# Altium schematic symbol library jlcpcb_2025_04_capacitors_extended_0402.schlib: 3594 symbols (part 19 of 20)
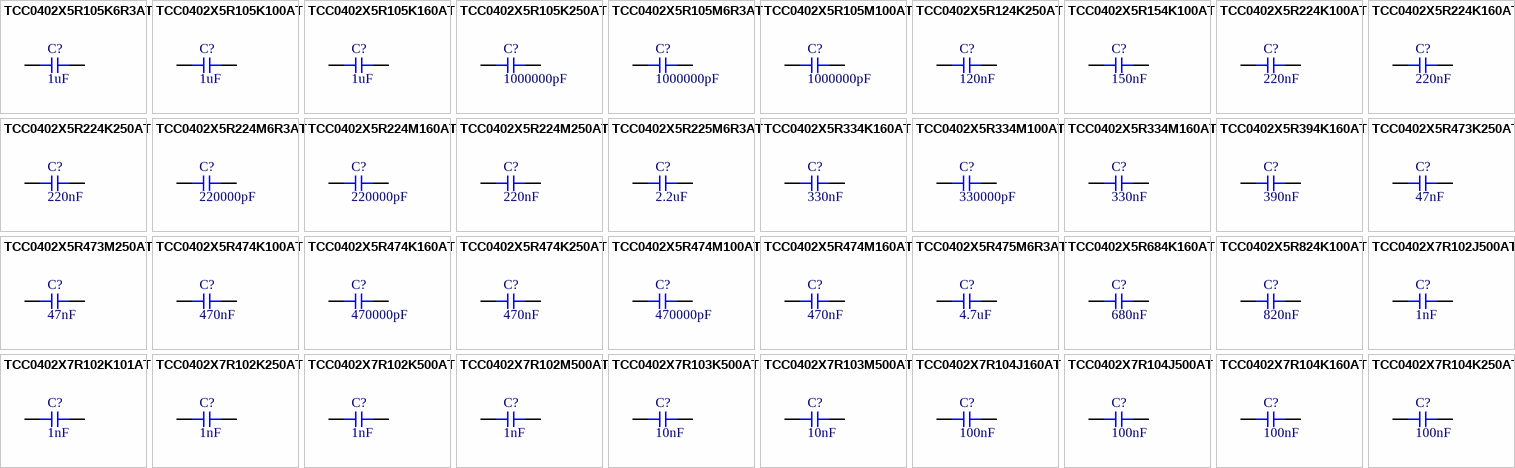
[diagram p107: symbols TCC0402X5R105K6R3AT to TCC0402X7R104K250AT]

## TCC0402X5R334M100AT
designator C?  Capacitance: 330000pF  (hidden comment: *)
Capacitor, Ceramic (MLCC), 330000pF, ±20%, 10V, X5R, ±20%, SMD 0402; Manufacturer: CCTC; Manufacturer Part Number: TCC0402X5R334M100AT; Package Size: 0402; JLCPCB Basic Part: No; JLCPCB Part Number: C5142578; Supplier 1: LCSC; Category: Capacitors - MLCC; Supplier Part Number 1: C5142578; Tolerance: ±20%; Voltage Rating: 10V; Temperature Coefficient: X5R; RoHS: Yes; ComponentLink1Description: Datasheet; ComponentLink1URL: https://wmsc.lcsc.com/wmsc/upload/file/pdf/v2/lcsc/2209011730_CCTC-TCC0402X5R334M100AT_C5142578.pdf; ComponentLink2Description: JLCPCB Part URL; ComponentLink2URL: https://jlcpcb.com/partdetail/C5142578; ComponentLink3Description: LCSC Part URL; ComponentLink3URL: https://lcsc.com/product-detail/Multilayer-Ceramic-Capacitors-MLCC---SMD-SMT_CCTC-CCTC-TCC0402X5R334M100AT_C5142578.html
footprint CAP-0402 (0402 (1005M) Capacitor)
pins: 1, 2

## TCC0402X5R334M160AT
designator C?  Capacitance: 330nF  (hidden comment: *)
Capacitor, Ceramic (MLCC), 330nF, ±20%, 16V, X5R, ±20%, SMD 0402; Manufacturer: CCTC; Manufacturer Part Number: TCC0402X5R334M160AT; Package Size: 0402; JLCPCB Basic Part: No; JLCPCB Part Number: C7393856; Supplier 1: LCSC; Category: Capacitors - MLCC; Supplier Part Number 1: C7393856; Tolerance: ±20%; Voltage Rating: 16V; Temperature Coefficient: X5R; RoHS: Yes; ComponentLink1Description: Datasheet; ComponentLink1URL: https://wmsc.lcsc.com/wmsc/upload/file/pdf/v2/lcsc/2306211554_CCTC-TCC0402X5R334M160AT_C7393856.pdf; ComponentLink2Description: JLCPCB Part URL; ComponentLink2URL: https://jlcpcb.com/partdetail/C7393856; ComponentLink3Description: LCSC Part URL; ComponentLink3URL: https://lcsc.com/product-detail/Multilayer-Ceramic-Capacitors-MLCC---SMD-SMT_CCTC-CCTC-TCC0402X5R334M160AT_C7393856.html
footprint CAP-0402 (0402 (1005M) Capacitor)
pins: 1, 2

## TCC0402X5R394K160AT
designator C?  Capacitance: 390nF  (hidden comment: *)
Capacitor, Ceramic (MLCC), 390nF, ±10%, 16V, X5R, ±10%, SMD 0402; Manufacturer: CCTC; Manufacturer Part Number: TCC0402X5R394K160AT; Package Size: 0402; JLCPCB Basic Part: No; JLCPCB Part Number: C7393858; Supplier 1: LCSC; Category: Capacitors - MLCC; Supplier Part Number 1: C7393858; Tolerance: ±10%; Voltage Rating: 16V; Temperature Coefficient: X5R; RoHS: Yes; ComponentLink1Description: Datasheet; ComponentLink1URL: https://wmsc.lcsc.com/wmsc/upload/file/pdf/v2/lcsc/2306211554_CCTC-TCC0402X5R394K160AT_C7393858.pdf; ComponentLink2Description: JLCPCB Part URL; ComponentLink2URL: https://jlcpcb.com/partdetail/C7393858; ComponentLink3Description: LCSC Part URL; ComponentLink3URL: https://lcsc.com/product-detail/Multilayer-Ceramic-Capacitors-MLCC---SMD-SMT_CCTC-CCTC-TCC0402X5R394K160AT_C7393858.html
footprint CAP-0402 (0402 (1005M) Capacitor)
pins: 1, 2

## TCC0402X5R473K250AT
designator C?  Capacitance: 47nF  (hidden comment: *)
Capacitor, Ceramic (MLCC), 47nF, ±10%, 25V, X5R, ±10%, SMD 0402; Manufacturer: CCTC; Manufacturer Part Number: TCC0402X5R473K250AT; Package Size: 0402; JLCPCB Basic Part: No; JLCPCB Part Number: C696842; Supplier 1: LCSC; Category: Capacitors - MLCC; Supplier Part Number 1: C696842; Tolerance: ±10%; Voltage Rating: 25V; Temperature Coefficient: X5R; RoHS: Yes; ComponentLink1Description: Datasheet; ComponentLink1URL: https://wmsc.lcsc.com/wmsc/upload/file/pdf/v2/lcsc/2304140030_CCTC-TCC0402X5R473K250AT_C696842.pdf; ComponentLink2Description: JLCPCB Part URL; ComponentLink2URL: https://jlcpcb.com/partdetail/C696842; ComponentLink3Description: LCSC Part URL; ComponentLink3URL: https://lcsc.com/product-detail/Multilayer-Ceramic-Capacitors-MLCC---SMD-SMT_CCTC-CCTC-TCC0402X5R473K250AT_C696842.html
footprint CAP-0402 (0402 (1005M) Capacitor)
pins: 1, 2

## TCC0402X5R473M250AT
designator C?  Capacitance: 47nF  (hidden comment: *)
Capacitor, Ceramic (MLCC), 47nF, ±20%, 25V, X5R, ±20%, SMD 0402; Manufacturer: CCTC; Manufacturer Part Number: TCC0402X5R473M250AT; Package Size: 0402; JLCPCB Basic Part: No; JLCPCB Part Number: C696864; Supplier 1: LCSC; Category: Capacitors - MLCC; Supplier Part Number 1: C696864; Tolerance: ±20%; Voltage Rating: 25V; Temperature Coefficient: X5R; RoHS: Yes; ComponentLink1Description: Datasheet; ComponentLink1URL: https://wmsc.lcsc.com/wmsc/upload/file/pdf/v2/lcsc/2304140030_CCTC-TCC0402X5R473M250AT_C696864.pdf; ComponentLink2Description: JLCPCB Part URL; ComponentLink2URL: https://jlcpcb.com/partdetail/C696864; ComponentLink3Description: LCSC Part URL; ComponentLink3URL: https://lcsc.com/product-detail/Multilayer-Ceramic-Capacitors-MLCC---SMD-SMT_CCTC-CCTC-TCC0402X5R473M250AT_C696864.html
footprint CAP-0402 (0402 (1005M) Capacitor)
pins: 1, 2

## TCC0402X5R474K100AT
designator C?  Capacitance: 470nF  (hidden comment: *)
Capacitor, Ceramic (MLCC), 470nF, ±10%, 10V, X5R, ±10%, SMD 0402; Manufacturer: CCTC; Manufacturer Part Number: TCC0402X5R474K100AT; Package Size: 0402; JLCPCB Basic Part: No; JLCPCB Part Number: C380299; Supplier 1: LCSC; Category: Capacitors - MLCC; Supplier Part Number 1: C380299; Tolerance: ±10%; Voltage Rating: 10V; Temperature Coefficient: X5R; RoHS: Yes; ComponentLink1Description: Datasheet; ComponentLink1URL: https://wmsc.lcsc.com/wmsc/upload/file/pdf/v2/lcsc/2304140030_CCTC-TCC0402X5R474K100AT_C380299.pdf; ComponentLink2Description: JLCPCB Part URL; ComponentLink2URL: https://jlcpcb.com/partdetail/C380299; ComponentLink3Description: LCSC Part URL; ComponentLink3URL: https://lcsc.com/product-detail/Multilayer-Ceramic-Capacitors-MLCC---SMD-SMT_CCTC-CCTC-TCC0402X5R474K100AT_C380299.html
footprint CAP-0402 (0402 (1005M) Capacitor)
pins: 1, 2

## TCC0402X5R474K160AT
designator C?  Capacitance: 470000pF  (hidden comment: *)
Capacitor, Ceramic (MLCC), 470000pF, ±10%, 16V, X5R, ±10%, SMD 0402; Manufacturer: CCTC; Manufacturer Part Number: TCC0402X5R474K160AT; Package Size: 0402; JLCPCB Basic Part: No; JLCPCB Part Number: C2887019; Supplier 1: LCSC; Category: Capacitors - MLCC; Supplier Part Number 1: C2887019; Tolerance: ±10%; Voltage Rating: 16V; Temperature Coefficient: X5R; RoHS: Yes; ComponentLink1Description: Datasheet; ComponentLink1URL: https://wmsc.lcsc.com/wmsc/upload/file/pdf/v2/lcsc/2108201430_CCTC-TCC0402X5R474K160AT_C2887019.pdf; ComponentLink2Description: JLCPCB Part URL; ComponentLink2URL: https://jlcpcb.com/partdetail/C2887019; ComponentLink3Description: LCSC Part URL; ComponentLink3URL: https://lcsc.com/product-detail/Multilayer-Ceramic-Capacitors-MLCC---SMD-SMT_CCTC-CCTC-TCC0402X5R474K160AT_C2887019.html
footprint CAP-0402 (0402 (1005M) Capacitor)
pins: 1, 2

## TCC0402X5R474K250AT
designator C?  Capacitance: 470nF  (hidden comment: *)
Capacitor, Ceramic (MLCC), 470nF, ±10%, 25V, X5R, ±10%, SMD 0402; Manufacturer: CCTC; Manufacturer Part Number: TCC0402X5R474K250AT; Package Size: 0402; JLCPCB Basic Part: No; JLCPCB Part Number: C5448876; Supplier 1: LCSC; Category: Capacitors - MLCC; Supplier Part Number 1: C5448876; Tolerance: ±10%; Voltage Rating: 25V; Temperature Coefficient: X5R; RoHS: Yes; ComponentLink1Description: Datasheet; ComponentLink1URL: https://wmsc.lcsc.com/wmsc/upload/file/pdf/v2/lcsc/2403281712_CCTC-TCC0402X5R474K250AT_C5448876.pdf; ComponentLink2Description: JLCPCB Part URL; ComponentLink2URL: https://jlcpcb.com/partdetail/C5448876; ComponentLink3Description: LCSC Part URL; ComponentLink3URL: https://lcsc.com/product-detail/Multilayer-Ceramic-Capacitors-MLCC---SMD-SMT_CCTC-CCTC-TCC0402X5R474K250AT_C5448876.html
footprint CAP-0402 (0402 (1005M) Capacitor)
pins: 1, 2

## TCC0402X5R474M100AT
designator C?  Capacitance: 470000pF  (hidden comment: *)
Capacitor, Ceramic (MLCC), 470000pF, ±20%, 10V, X5R, ±20%, SMD 0402; Manufacturer: CCTC; Manufacturer Part Number: TCC0402X5R474M100AT; Package Size: 0402; JLCPCB Basic Part: No; JLCPCB Part Number: C5142573; Supplier 1: LCSC; Category: Capacitors - MLCC; Supplier Part Number 1: C5142573; Tolerance: ±20%; Voltage Rating: 10V; Temperature Coefficient: X5R; RoHS: Yes; ComponentLink1Description: Datasheet; ComponentLink1URL: https://wmsc.lcsc.com/wmsc/upload/file/pdf/v2/lcsc/2209011730_CCTC-TCC0402X5R474M100AT_C5142573.pdf; ComponentLink2Description: JLCPCB Part URL; ComponentLink2URL: https://jlcpcb.com/partdetail/C5142573; ComponentLink3Description: LCSC Part URL; ComponentLink3URL: https://lcsc.com/product-detail/Multilayer-Ceramic-Capacitors-MLCC---SMD-SMT_CCTC-CCTC-TCC0402X5R474M100AT_C5142573.html
footprint CAP-0402 (0402 (1005M) Capacitor)
pins: 1, 2

## TCC0402X5R474M160AT
designator C?  Capacitance: 470nF  (hidden comment: *)
Capacitor, Ceramic (MLCC), 470nF, ±20%, 16V, X5R, ±20%, SMD 0402; Manufacturer: CCTC; Manufacturer Part Number: TCC0402X5R474M160AT; Package Size: 0402; JLCPCB Basic Part: No; JLCPCB Part Number: C7393859; Supplier 1: LCSC; Category: Capacitors - MLCC; Supplier Part Number 1: C7393859; Tolerance: ±20%; Voltage Rating: 16V; Temperature Coefficient: X5R; RoHS: Yes; ComponentLink1Description: Datasheet; ComponentLink1URL: https://wmsc.lcsc.com/wmsc/upload/file/pdf/v2/lcsc/2306211554_CCTC-TCC0402X5R474M160AT_C7393859.pdf; ComponentLink2Description: JLCPCB Part URL; ComponentLink2URL: https://jlcpcb.com/partdetail/C7393859; ComponentLink3Description: LCSC Part URL; ComponentLink3URL: https://lcsc.com/product-detail/Multilayer-Ceramic-Capacitors-MLCC---SMD-SMT_CCTC-CCTC-TCC0402X5R474M160AT_C7393859.html
footprint CAP-0402 (0402 (1005M) Capacitor)
pins: 1, 2

## TCC0402X5R475M6R3AT
designator C?  Capacitance: 4.7uF  (hidden comment: *)
Capacitor, Ceramic (MLCC), 4.7uF, ±20%, 6.3V, X5R, ±20%, SMD 0402; Manufacturer: CCTC; Manufacturer Part Number: TCC0402X5R475M6R3AT; Package Size: 0402; JLCPCB Basic Part: No; JLCPCB Part Number: C380302; Supplier 1: LCSC; Category: Capacitors - MLCC; Supplier Part Number 1: C380302; Tolerance: ±20%; Voltage Rating: 6.3V; Temperature Coefficient: X5R; RoHS: Yes; ComponentLink1Description: Datasheet; ComponentLink1URL: https://wmsc.lcsc.com/wmsc/upload/file/pdf/v2/lcsc/2304140030_CCTC-TCC0402X5R475M6R3AT_C380302.pdf; ComponentLink2Description: JLCPCB Part URL; ComponentLink2URL: https://jlcpcb.com/partdetail/C380302; ComponentLink3Description: LCSC Part URL; ComponentLink3URL: https://lcsc.com/product-detail/Multilayer-Ceramic-Capacitors-MLCC---SMD-SMT_CCTC-CCTC-TCC0402X5R475M6R3AT_C380302.html
footprint CAP-0402 (0402 (1005M) Capacitor)
pins: 1, 2

## TCC0402X5R684K160AT
designator C?  Capacitance: 680nF  (hidden comment: *)
Capacitor, Ceramic (MLCC), 680nF, ±10%, 16V, X5R, ±10%, SMD 0402; Manufacturer: CCTC; Manufacturer Part Number: TCC0402X5R684K160AT; Package Size: 0402; JLCPCB Basic Part: No; JLCPCB Part Number: C18164600; Supplier 1: LCSC; Category: Capacitors - MLCC; Supplier Part Number 1: C18164600; Tolerance: ±10%; Voltage Rating: 16V; Temperature Coefficient: X5R; RoHS: Yes; ComponentLink1Description: Datasheet; ComponentLink1URL: https://wmsc.lcsc.com/wmsc/upload/file/pdf/v2/lcsc/2309141701_CCTC-TCC0402X5R684K160AT_C18164600.pdf; ComponentLink2Description: JLCPCB Part URL; ComponentLink2URL: https://jlcpcb.com/partdetail/C18164600; ComponentLink3Description: LCSC Part URL; ComponentLink3URL: https://lcsc.com/product-detail/Multilayer-Ceramic-Capacitors-MLCC---SMD-SMT_CCTC-CCTC-TCC0402X5R684K160AT_C18164600.html
footprint CAP-0402 (0402 (1005M) Capacitor)
pins: 1, 2

## TCC0402X5R824K100AT
designator C?  Capacitance: 820nF  (hidden comment: *)
Capacitor, Ceramic (MLCC), 820nF, ±10%, 10V, X5R, ±10%, SMD 0402; Manufacturer: CCTC; Manufacturer Part Number: TCC0402X5R824K100AT; Package Size: 0402; JLCPCB Basic Part: No; JLCPCB Part Number: C7393863; Supplier 1: LCSC; Category: Capacitors - MLCC; Supplier Part Number 1: C7393863; Tolerance: ±10%; Voltage Rating: 10V; Temperature Coefficient: X5R; RoHS: Yes; ComponentLink1Description: Datasheet; ComponentLink1URL: https://wmsc.lcsc.com/wmsc/upload/file/pdf/v2/lcsc/2306211554_CCTC-TCC0402X5R824K100AT_C7393863.pdf; ComponentLink2Description: JLCPCB Part URL; ComponentLink2URL: https://jlcpcb.com/partdetail/C7393863; ComponentLink3Description: LCSC Part URL; ComponentLink3URL: https://lcsc.com/product-detail/Multilayer-Ceramic-Capacitors-MLCC---SMD-SMT_CCTC-CCTC-TCC0402X5R824K100AT_C7393863.html
footprint CAP-0402 (0402 (1005M) Capacitor)
pins: 1, 2

## TCC0402X7R102J500AT
designator C?  Capacitance: 1nF  (hidden comment: *)
Capacitor, Ceramic (MLCC), 1nF, ±5%, 50V, X7R, ±5%, SMD 0402; Manufacturer: CCTC; Manufacturer Part Number: TCC0402X7R102J500AT; Package Size: 0402; JLCPCB Basic Part: No; JLCPCB Part Number: C5448821; Supplier 1: LCSC; Category: Capacitors - MLCC; Supplier Part Number 1: C5448821; Tolerance: ±5%; Voltage Rating: 50V; Temperature Coefficient: X7R; RoHS: Yes; ComponentLink1Description: Datasheet; ComponentLink2Description: JLCPCB Part URL; ComponentLink2URL: https://jlcpcb.com/partdetail/C5448821; ComponentLink3Description: LCSC Part URL; ComponentLink3URL: https://lcsc.com/product-detail/Multilayer-Ceramic-Capacitors-MLCC---SMD-SMT_CCTC-CCTC-TCC0402X7R102J500AT_C5448821.html
footprint CAP-0402 (0402 (1005M) Capacitor)
pins: 1, 2

## TCC0402X7R102K101AT
designator C?  Capacitance: 1nF  (hidden comment: *)
Capacitor, Ceramic (MLCC), 1nF, ±10%, 100V, X7R, ±10%, SMD 0402; Manufacturer: CCTC; Manufacturer Part Number: TCC0402X7R102K101AT; Package Size: 0402; JLCPCB Basic Part: No; JLCPCB Part Number: C5448841; Supplier 1: LCSC; Category: Capacitors - MLCC; Supplier Part Number 1: C5448841; Tolerance: ±10%; Voltage Rating: 100V; Temperature Coefficient: X7R; RoHS: Yes; ComponentLink1Description: Datasheet; ComponentLink1URL: https://wmsc.lcsc.com/wmsc/upload/file/pdf/v2/lcsc/2403281712_CCTC-TCC0402X7R102K101AT_C5448841.pdf; ComponentLink2Description: JLCPCB Part URL; ComponentLink2URL: https://jlcpcb.com/partdetail/C5448841; ComponentLink3Description: LCSC Part URL; ComponentLink3URL: https://lcsc.com/product-detail/Multilayer-Ceramic-Capacitors-MLCC---SMD-SMT_CCTC-CCTC-TCC0402X7R102K101AT_C5448841.html
footprint CAP-0402 (0402 (1005M) Capacitor)
pins: 1, 2

## TCC0402X7R102K250AT
designator C?  Capacitance: 1nF  (hidden comment: *)
Capacitor, Ceramic (MLCC), 1nF, ±10%, 25V, X7R, ±10%, SMD 0402; Manufacturer: CCTC; Manufacturer Part Number: TCC0402X7R102K250AT; Package Size: 0402; JLCPCB Basic Part: No; JLCPCB Part Number: C2932180; Supplier 1: LCSC; Category: Capacitors - MLCC; Supplier Part Number 1: C2932180; Tolerance: ±10%; Voltage Rating: 25V; Temperature Coefficient: X7R; RoHS: Yes; ComponentLink1Description: Datasheet; ComponentLink1URL: https://wmsc.lcsc.com/wmsc/upload/file/pdf/v2/lcsc/2201121530_CCTC-TCC0402X7R102K250AT_C2932180.pdf; ComponentLink2Description: JLCPCB Part URL; ComponentLink2URL: https://jlcpcb.com/partdetail/C2932180; ComponentLink3Description: LCSC Part URL; ComponentLink3URL: https://lcsc.com/product-detail/Multilayer-Ceramic-Capacitors-MLCC---SMD-SMT_CCTC-CCTC-TCC0402X7R102K250AT_C2932180.html
footprint CAP-0402 (0402 (1005M) Capacitor)
pins: 1, 2

## TCC0402X7R102K500AT
designator C?  Capacitance: 1nF  (hidden comment: *)
Capacitor, Ceramic (MLCC), 1nF, ±10%, 50V, X7R, ±10%, SMD 0402; Manufacturer: CCTC; Manufacturer Part Number: TCC0402X7R102K500AT; Package Size: 0402; JLCPCB Basic Part: No; JLCPCB Part Number: C466233; Supplier 1: LCSC; Category: Capacitors - MLCC; Supplier Part Number 1: C466233; Tolerance: ±10%; Voltage Rating: 50V; Temperature Coefficient: X7R; RoHS: Yes; ComponentLink1Description: Datasheet; ComponentLink1URL: https://wmsc.lcsc.com/wmsc/upload/file/pdf/v2/lcsc/2304140030_CCTC-TCC0402X7R102K500AT_C466233.pdf; ComponentLink2Description: JLCPCB Part URL; ComponentLink2URL: https://jlcpcb.com/partdetail/C466233; ComponentLink3Description: LCSC Part URL; ComponentLink3URL: https://lcsc.com/product-detail/Multilayer-Ceramic-Capacitors-MLCC---SMD-SMT_CCTC-CCTC-TCC0402X7R102K500AT_C466233.html
footprint CAP-0402 (0402 (1005M) Capacitor)
pins: 1, 2

## TCC0402X7R102M500AT
designator C?  Capacitance: 1nF  (hidden comment: *)
Capacitor, Ceramic (MLCC), 1nF, ±20%, 50V, X7R, ±20%, SMD 0402; Manufacturer: CCTC; Manufacturer Part Number: TCC0402X7R102M500AT; Package Size: 0402; JLCPCB Basic Part: No; JLCPCB Part Number: C696907; Supplier 1: LCSC; Category: Capacitors - MLCC; Supplier Part Number 1: C696907; Tolerance: ±20%; Voltage Rating: 50V; Temperature Coefficient: X7R; RoHS: Yes; ComponentLink1Description: Datasheet; ComponentLink1URL: https://wmsc.lcsc.com/wmsc/upload/file/pdf/v2/lcsc/2304140030_CCTC-TCC0402X7R102M500AT_C696907.pdf; ComponentLink2Description: JLCPCB Part URL; ComponentLink2URL: https://jlcpcb.com/partdetail/C696907; ComponentLink3Description: LCSC Part URL; ComponentLink3URL: https://lcsc.com/product-detail/Multilayer-Ceramic-Capacitors-MLCC---SMD-SMT_CCTC-CCTC-TCC0402X7R102M500AT_C696907.html
footprint CAP-0402 (0402 (1005M) Capacitor)
pins: 1, 2

## TCC0402X7R103K500AT
designator C?  Capacitance: 10nF  (hidden comment: *)
Capacitor, Ceramic (MLCC), 10nF, ±10%, 50V, X7R, ±10%, SMD 0402; Manufacturer: CCTC; Manufacturer Part Number: TCC0402X7R103K500AT; Package Size: 0402; JLCPCB Basic Part: No; JLCPCB Part Number: C688874; Supplier 1: LCSC; Category: Capacitors - MLCC; Supplier Part Number 1: C688874; Tolerance: ±10%; Voltage Rating: 50V; Temperature Coefficient: X7R; RoHS: Yes; ComponentLink1Description: Datasheet; ComponentLink1URL: https://wmsc.lcsc.com/wmsc/upload/file/pdf/v2/lcsc/2304140030_CCTC-TCC0402X7R103K500AT_C688874.pdf; ComponentLink2Description: JLCPCB Part URL; ComponentLink2URL: https://jlcpcb.com/partdetail/C688874; ComponentLink3Description: LCSC Part URL; ComponentLink3URL: https://lcsc.com/product-detail/Multilayer-Ceramic-Capacitors-MLCC---SMD-SMT_CCTC-CCTC-TCC0402X7R103K500AT_C688874.html
footprint CAP-0402 (0402 (1005M) Capacitor)
pins: 1, 2

## TCC0402X7R103M500AT
designator C?  Capacitance: 10nF  (hidden comment: *)
Capacitor, Ceramic (MLCC), 10nF, ±20%, 50V, X7R, ±20%, SMD 0402; Manufacturer: CCTC; Manufacturer Part Number: TCC0402X7R103M500AT; Package Size: 0402; JLCPCB Basic Part: No; JLCPCB Part Number: C696856; Supplier 1: LCSC; Category: Capacitors - MLCC; Supplier Part Number 1: C696856; Tolerance: ±20%; Voltage Rating: 50V; Temperature Coefficient: X7R; RoHS: Yes; ComponentLink1Description: Datasheet; ComponentLink1URL: https://wmsc.lcsc.com/wmsc/upload/file/pdf/v2/lcsc/2304140030_CCTC-TCC0402X7R103M500AT_C696856.pdf; ComponentLink2Description: JLCPCB Part URL; ComponentLink2URL: https://jlcpcb.com/partdetail/C696856; ComponentLink3Description: LCSC Part URL; ComponentLink3URL: https://lcsc.com/product-detail/Multilayer-Ceramic-Capacitors-MLCC---SMD-SMT_CCTC-CCTC-TCC0402X7R103M500AT_C696856.html
footprint CAP-0402 (0402 (1005M) Capacitor)
pins: 1, 2

## TCC0402X7R104J160AT
designator C?  Capacitance: 100nF  (hidden comment: *)
Capacitor, Ceramic (MLCC), 100nF, ±5%, 16V, X7R, ±5%, SMD 0402; Manufacturer: CCTC; Manufacturer Part Number: TCC0402X7R104J160AT; Package Size: 0402; JLCPCB Basic Part: No; JLCPCB Part Number: C5448875; Supplier 1: LCSC; Category: Capacitors - MLCC; Supplier Part Number 1: C5448875; Tolerance: ±5%; Voltage Rating: 16V; Temperature Coefficient: X7R; RoHS: Yes; ComponentLink1Description: Datasheet; ComponentLink2Description: JLCPCB Part URL; ComponentLink2URL: https://jlcpcb.com/partdetail/C5448875; ComponentLink3Description: LCSC Part URL; ComponentLink3URL: https://lcsc.com/product-detail/Multilayer-Ceramic-Capacitors-MLCC---SMD-SMT_CCTC-CCTC-TCC0402X7R104J160AT_C5448875.html
footprint CAP-0402 (0402 (1005M) Capacitor)
pins: 1, 2

## TCC0402X7R104J500AT
designator C?  Capacitance: 100nF  (hidden comment: *)
Capacitor, Ceramic (MLCC), 100nF, ±5%, null, X7R, ±5%, SMD 0402; Manufacturer: CCTC; Manufacturer Part Number: TCC0402X7R104J500AT; Package Size: 0402; JLCPCB Basic Part: No; JLCPCB Part Number: C5448844; Supplier 1: LCSC; Category: Capacitors - MLCC; Supplier Part Number 1: C5448844; Tolerance: ±5%; Voltage Rating: null; Temperature Coefficient: X7R; RoHS: Yes; ComponentLink1Description: Datasheet; ComponentLink1URL: https://wmsc.lcsc.com/wmsc/upload/file/pdf/v2/lcsc/2311281730_CCTC-TCC0402X7R104J500AT_C5448844.pdf; ComponentLink2Description: JLCPCB Part URL; ComponentLink2URL: https://jlcpcb.com/partdetail/C5448844; ComponentLink3Description: LCSC Part URL; ComponentLink3URL: https://lcsc.com/product-detail/Multilayer-Ceramic-Capacitors-MLCC---SMD-SMT_CCTC-CCTC-TCC0402X7R104J500AT_C5448844.html
footprint CAP-0402 (0402 (1005M) Capacitor)
pins: 1, 2

## TCC0402X7R104K160AT
designator C?  Capacitance: 100nF  (hidden comment: *)
Capacitor, Ceramic (MLCC), 100nF, ±10%, 16V, X7R, ±10%, SMD 0402; Manufacturer: CCTC; Manufacturer Part Number: TCC0402X7R104K160AT; Package Size: 0402; JLCPCB Basic Part: No; JLCPCB Part Number: C392963; Supplier 1: LCSC; Category: Capacitors - MLCC; Supplier Part Number 1: C392963; Tolerance: ±10%; Voltage Rating: 16V; Temperature Coefficient: X7R; RoHS: Yes; ComponentLink1Description: Datasheet; ComponentLink1URL: https://wmsc.lcsc.com/wmsc/upload/file/pdf/v2/lcsc/2304140030_CCTC-TCC0402X7R104K160AT_C392963.pdf; ComponentLink2Description: JLCPCB Part URL; ComponentLink2URL: https://jlcpcb.com/partdetail/C392963; ComponentLink3Description: LCSC Part URL; ComponentLink3URL: https://lcsc.com/product-detail/Multilayer-Ceramic-Capacitors-MLCC---SMD-SMT_CCTC-CCTC-TCC0402X7R104K160AT_C392963.html
footprint CAP-0402 (0402 (1005M) Capacitor)
pins: 1, 2

## TCC0402X7R104K250AT
designator C?  Capacitance: 100nF  (hidden comment: *)
Capacitor, Ceramic (MLCC), 100nF, ±10%, 25V, X7R, ±10%, SMD 0402; Manufacturer: CCTC; Manufacturer Part Number: TCC0402X7R104K250AT; Package Size: 0402; JLCPCB Basic Part: No; JLCPCB Part Number: C466234; Supplier 1: LCSC; Category: Capacitors - MLCC; Supplier Part Number 1: C466234; Tolerance: ±10%; Voltage Rating: 25V; Temperature Coefficient: X7R; RoHS: Yes; ComponentLink1Description: Datasheet; ComponentLink1URL: https://wmsc.lcsc.com/wmsc/upload/file/pdf/v2/lcsc/2304140030_CCTC-TCC0402X7R104K250AT_C466234.pdf; ComponentLink2Description: JLCPCB Part URL; ComponentLink2URL: https://jlcpcb.com/partdetail/C466234; ComponentLink3Description: LCSC Part URL; ComponentLink3URL: https://lcsc.com/product-detail/Multilayer-Ceramic-Capacitors-MLCC---SMD-SMT_CCTC-CCTC-TCC0402X7R104K250AT_C466234.html
footprint CAP-0402 (0402 (1005M) Capacitor)
pins: 1, 2

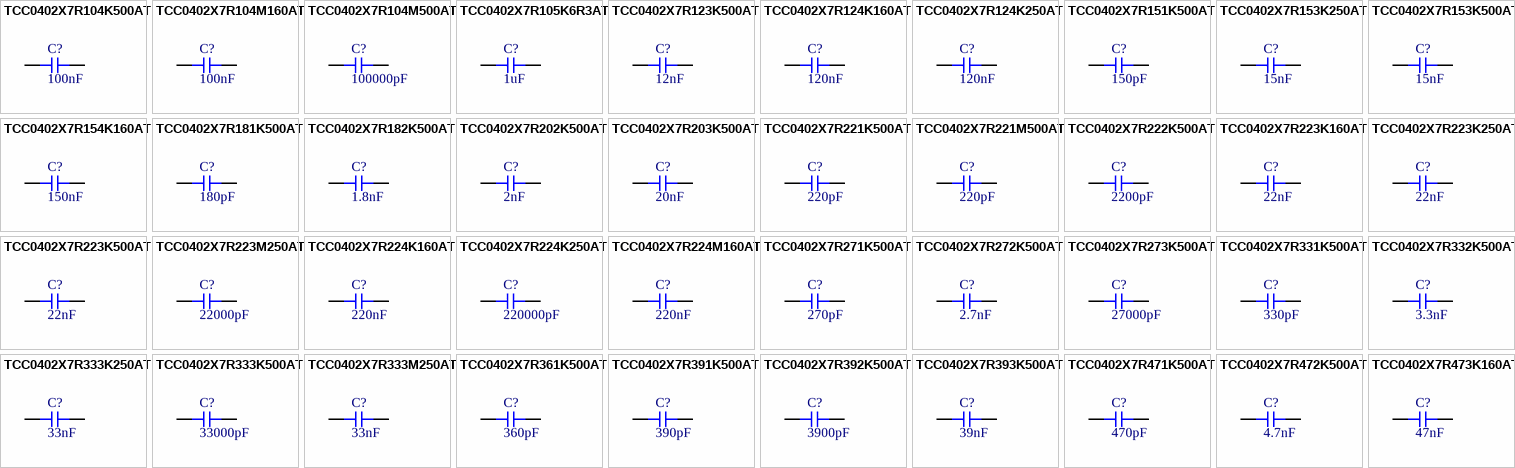
[diagram p84: symbols TCC0402X7R104K500AT to TCC0402X7R473K160AT]

## TCC0402X7R104K500AT
designator C?  Capacitance: 100nF  (hidden comment: *)
Capacitor, Ceramic (MLCC), 100nF, ±10%, 50V, X7R, ±10%, SMD 0402; Manufacturer: CCTC; Manufacturer Part Number: TCC0402X7R104K500AT; Package Size: 0402; JLCPCB Basic Part: No; JLCPCB Part Number: C5448791; Supplier 1: LCSC; Category: Capacitors - MLCC; Supplier Part Number 1: C5448791; Tolerance: ±10%; Voltage Rating: 50V; Temperature Coefficient: X7R; RoHS: Yes; ComponentLink1Description: Datasheet; ComponentLink1URL: https://wmsc.lcsc.com/wmsc/upload/file/pdf/v2/lcsc/2403281711_CCTC-TCC0402X7R104K500AT_C5448791.pdf; ComponentLink2Description: JLCPCB Part URL; ComponentLink2URL: https://jlcpcb.com/partdetail/C5448791; ComponentLink3Description: LCSC Part URL; ComponentLink3URL: https://lcsc.com/product-detail/Multilayer-Ceramic-Capacitors-MLCC---SMD-SMT_CCTC-CCTC-TCC0402X7R104K500AT_C5448791.html
footprint CAP-0402 (0402 (1005M) Capacitor)
pins: 1, 2

## TCC0402X7R104M160AT
designator C?  Capacitance: 100nF  (hidden comment: *)
Capacitor, Ceramic (MLCC), 100nF, ±20%, 16V, X7R, ±20%, SMD 0402; Manufacturer: CCTC; Manufacturer Part Number: TCC0402X7R104M160AT; Package Size: 0402; JLCPCB Basic Part: No; JLCPCB Part Number: C880604; Supplier 1: LCSC; Category: Capacitors - MLCC; Supplier Part Number 1: C880604; Tolerance: ±20%; Voltage Rating: 16V; Temperature Coefficient: X7R; RoHS: Yes; ComponentLink1Description: Datasheet; ComponentLink1URL: https://wmsc.lcsc.com/wmsc/upload/file/pdf/v2/lcsc/2304140030_CCTC-TCC0402X7R104M160AT_C880604.pdf; ComponentLink2Description: JLCPCB Part URL; ComponentLink2URL: https://jlcpcb.com/partdetail/C880604; ComponentLink3Description: LCSC Part URL; ComponentLink3URL: https://lcsc.com/product-detail/Multilayer-Ceramic-Capacitors-MLCC---SMD-SMT_CCTC-CCTC-TCC0402X7R104M160AT_C880604.html
footprint CAP-0402 (0402 (1005M) Capacitor)
pins: 1, 2

## TCC0402X7R104M500AT
designator C?  Capacitance: 100000pF  (hidden comment: *)
Capacitor, Ceramic (MLCC), 100000pF, ±20%, 50V, X7R, ±20%, SMD 0402; Manufacturer: CCTC; Manufacturer Part Number: TCC0402X7R104M500AT; Package Size: 0402; JLCPCB Basic Part: No; JLCPCB Part Number: C5142567; Supplier 1: LCSC; Category: Capacitors - MLCC; Supplier Part Number 1: C5142567; Tolerance: ±20%; Voltage Rating: 50V; Temperature Coefficient: X7R; RoHS: Yes; ComponentLink1Description: Datasheet; ComponentLink1URL: https://wmsc.lcsc.com/wmsc/upload/file/pdf/v2/lcsc/2209011730_CCTC-TCC0402X7R104M500AT_C5142567.pdf; ComponentLink2Description: JLCPCB Part URL; ComponentLink2URL: https://jlcpcb.com/partdetail/C5142567; ComponentLink3Description: LCSC Part URL; ComponentLink3URL: https://lcsc.com/product-detail/Multilayer-Ceramic-Capacitors-MLCC---SMD-SMT_CCTC-CCTC-TCC0402X7R104M500AT_C5142567.html
footprint CAP-0402 (0402 (1005M) Capacitor)
pins: 1, 2

## TCC0402X7R105K6R3AT
designator C?  Capacitance: 1uF  (hidden comment: *)
Capacitor, Ceramic (MLCC), 1uF, ±10%, 6.3V, X7R, ±10%, SMD 0402; Manufacturer: CCTC; Manufacturer Part Number: TCC0402X7R105K6R3AT; Package Size: 0402; JLCPCB Basic Part: No; JLCPCB Part Number: C5448871; Supplier 1: LCSC; Category: Capacitors - MLCC; Supplier Part Number 1: C5448871; Tolerance: ±10%; Voltage Rating: 6.3V; Temperature Coefficient: X7R; RoHS: Yes; ComponentLink1Description: Datasheet; ComponentLink2Description: JLCPCB Part URL; ComponentLink2URL: https://jlcpcb.com/partdetail/C5448871; ComponentLink3Description: LCSC Part URL; ComponentLink3URL: https://lcsc.com/product-detail/Multilayer-Ceramic-Capacitors-MLCC---SMD-SMT_CCTC-CCTC-TCC0402X7R105K6R3AT_C5448871.html
footprint CAP-0402 (0402 (1005M) Capacitor)
pins: 1, 2

## TCC0402X7R123K500AT
designator C?  Capacitance: 12nF  (hidden comment: *)
Capacitor, Ceramic (MLCC), 12nF, ±10%, 50V, X7R, ±10%, SMD 0402; Manufacturer: CCTC; Manufacturer Part Number: TCC0402X7R123K500AT; Package Size: 0402; JLCPCB Basic Part: No; JLCPCB Part Number: C880620; Supplier 1: LCSC; Category: Capacitors - MLCC; Supplier Part Number 1: C880620; Tolerance: ±10%; Voltage Rating: 50V; Temperature Coefficient: X7R; RoHS: Yes; ComponentLink1Description: Datasheet; ComponentLink1URL: https://wmsc.lcsc.com/wmsc/upload/file/pdf/v2/lcsc/2304140030_CCTC-TCC0402X7R123K500AT_C880620.pdf; ComponentLink2Description: JLCPCB Part URL; ComponentLink2URL: https://jlcpcb.com/partdetail/C880620; ComponentLink3Description: LCSC Part URL; ComponentLink3URL: https://lcsc.com/product-detail/Multilayer-Ceramic-Capacitors-MLCC---SMD-SMT_CCTC-CCTC-TCC0402X7R123K500AT_C880620.html
footprint CAP-0402 (0402 (1005M) Capacitor)
pins: 1, 2

## TCC0402X7R124K160AT
designator C?  Capacitance: 120nF  (hidden comment: *)
Capacitor, Ceramic (MLCC), 120nF, ±10%, 16V, X7R, ±10%, SMD 0402; Manufacturer: CCTC; Manufacturer Part Number: TCC0402X7R124K160AT; Package Size: 0402; JLCPCB Basic Part: No; JLCPCB Part Number: C7393864; Supplier 1: LCSC; Category: Capacitors - MLCC; Supplier Part Number 1: C7393864; Tolerance: ±10%; Voltage Rating: 16V; Temperature Coefficient: X7R; RoHS: Yes; ComponentLink1Description: Datasheet; ComponentLink1URL: https://wmsc.lcsc.com/wmsc/upload/file/pdf/v2/lcsc/2306211554_CCTC-TCC0402X7R124K160AT_C7393864.pdf; ComponentLink2Description: JLCPCB Part URL; ComponentLink2URL: https://jlcpcb.com/partdetail/C7393864; ComponentLink3Description: LCSC Part URL; ComponentLink3URL: https://lcsc.com/product-detail/Multilayer-Ceramic-Capacitors-MLCC---SMD-SMT_CCTC-CCTC-TCC0402X7R124K160AT_C7393864.html
footprint CAP-0402 (0402 (1005M) Capacitor)
pins: 1, 2

## TCC0402X7R124K250AT
designator C?  Capacitance: 120nF  (hidden comment: *)
Capacitor, Ceramic (MLCC), 120nF, ±10%, 25V, X7R, ±10%, SMD 0402; Manufacturer: CCTC; Manufacturer Part Number: TCC0402X7R124K250AT; Package Size: 0402; JLCPCB Basic Part: No; JLCPCB Part Number: C5448880; Supplier 1: LCSC; Category: Capacitors - MLCC; Supplier Part Number 1: C5448880; Tolerance: ±10%; Voltage Rating: 25V; Temperature Coefficient: X7R; RoHS: Yes; ComponentLink1Description: Datasheet; ComponentLink1URL: https://wmsc.lcsc.com/wmsc/upload/file/pdf/v2/lcsc/2403281712_CCTC-TCC0402X7R124K250AT_C5448880.pdf; ComponentLink2Description: JLCPCB Part URL; ComponentLink2URL: https://jlcpcb.com/partdetail/C5448880; ComponentLink3Description: LCSC Part URL; ComponentLink3URL: https://lcsc.com/product-detail/Multilayer-Ceramic-Capacitors-MLCC---SMD-SMT_CCTC-CCTC-TCC0402X7R124K250AT_C5448880.html
footprint CAP-0402 (0402 (1005M) Capacitor)
pins: 1, 2

## TCC0402X7R151K500AT
designator C?  Capacitance: 150pF  (hidden comment: *)
Capacitor, Ceramic (MLCC), 150pF, ±10%, 50V, X7R, ±10%, SMD 0402; Manufacturer: CCTC; Manufacturer Part Number: TCC0402X7R151K500AT; Package Size: 0402; JLCPCB Basic Part: No; JLCPCB Part Number: C466235; Supplier 1: LCSC; Category: Capacitors - MLCC; Supplier Part Number 1: C466235; Tolerance: ±10%; Voltage Rating: 50V; Temperature Coefficient: X7R; RoHS: Yes; ComponentLink1Description: Datasheet; ComponentLink1URL: https://wmsc.lcsc.com/wmsc/upload/file/pdf/v2/lcsc/2304140030_CCTC-TCC0402X7R151K500AT_C466235.pdf; ComponentLink2Description: JLCPCB Part URL; ComponentLink2URL: https://jlcpcb.com/partdetail/C466235; ComponentLink3Description: LCSC Part URL; ComponentLink3URL: https://lcsc.com/product-detail/Multilayer-Ceramic-Capacitors-MLCC---SMD-SMT_CCTC-CCTC-TCC0402X7R151K500AT_C466235.html
footprint CAP-0402 (0402 (1005M) Capacitor)
pins: 1, 2

## TCC0402X7R153K250AT
designator C?  Capacitance: 15nF  (hidden comment: *)
Capacitor, Ceramic (MLCC), 15nF, ±10%, 25V, X7R, ±10%, SMD 0402; Manufacturer: CCTC; Manufacturer Part Number: TCC0402X7R153K250AT; Package Size: 0402; JLCPCB Basic Part: No; JLCPCB Part Number: C380303; Supplier 1: LCSC; Category: Capacitors - MLCC; Supplier Part Number 1: C380303; Tolerance: ±10%; Voltage Rating: 25V; Temperature Coefficient: X7R; RoHS: Yes; ComponentLink1Description: Datasheet; ComponentLink1URL: https://wmsc.lcsc.com/wmsc/upload/file/pdf/v2/lcsc/2304140030_CCTC-TCC0402X7R153K250AT_C380303.pdf; ComponentLink2Description: JLCPCB Part URL; ComponentLink2URL: https://jlcpcb.com/partdetail/C380303; ComponentLink3Description: LCSC Part URL; ComponentLink3URL: https://lcsc.com/product-detail/Multilayer-Ceramic-Capacitors-MLCC---SMD-SMT_CCTC-CCTC-TCC0402X7R153K250AT_C380303.html
footprint CAP-0402 (0402 (1005M) Capacitor)
pins: 1, 2

## TCC0402X7R153K500AT
designator C?  Capacitance: 15nF  (hidden comment: *)
Capacitor, Ceramic (MLCC), 15nF, ±10%, 50V, X7R, ±10%, SMD 0402; Manufacturer: CCTC; Manufacturer Part Number: TCC0402X7R153K500AT; Package Size: 0402; JLCPCB Basic Part: No; JLCPCB Part Number: C696852; Supplier 1: LCSC; Category: Capacitors - MLCC; Supplier Part Number 1: C696852; Tolerance: ±10%; Voltage Rating: 50V; Temperature Coefficient: X7R; RoHS: Yes; ComponentLink1Description: Datasheet; ComponentLink1URL: https://wmsc.lcsc.com/wmsc/upload/file/pdf/v2/lcsc/2304140030_CCTC-TCC0402X7R153K500AT_C696852.pdf; ComponentLink2Description: JLCPCB Part URL; ComponentLink2URL: https://jlcpcb.com/partdetail/C696852; ComponentLink3Description: LCSC Part URL; ComponentLink3URL: https://lcsc.com/product-detail/Multilayer-Ceramic-Capacitors-MLCC---SMD-SMT_CCTC-CCTC-TCC0402X7R153K500AT_C696852.html
footprint CAP-0402 (0402 (1005M) Capacitor)
pins: 1, 2

## TCC0402X7R154K160AT
designator C?  Capacitance: 150nF  (hidden comment: *)
Capacitor, Ceramic (MLCC), 150nF, ±10%, 16V, X7R, ±10%, SMD 0402; Manufacturer: CCTC; Manufacturer Part Number: TCC0402X7R154K160AT; Package Size: 0402; JLCPCB Basic Part: No; JLCPCB Part Number: C7393865; Supplier 1: LCSC; Category: Capacitors - MLCC; Supplier Part Number 1: C7393865; Tolerance: ±10%; Voltage Rating: 16V; Temperature Coefficient: X7R; RoHS: Yes; ComponentLink1Description: Datasheet; ComponentLink1URL: https://wmsc.lcsc.com/wmsc/upload/file/pdf/v2/lcsc/2306211554_CCTC-TCC0402X7R154K160AT_C7393865.pdf; ComponentLink2Description: JLCPCB Part URL; ComponentLink2URL: https://jlcpcb.com/partdetail/C7393865; ComponentLink3Description: LCSC Part URL; ComponentLink3URL: https://lcsc.com/product-detail/Multilayer-Ceramic-Capacitors-MLCC---SMD-SMT_CCTC-CCTC-TCC0402X7R154K160AT_C7393865.html
footprint CAP-0402 (0402 (1005M) Capacitor)
pins: 1, 2

## TCC0402X7R181K500AT
designator C?  Capacitance: 180pF  (hidden comment: *)
Capacitor, Ceramic (MLCC), 180pF, ±10%, 50V, X7R, ±10%, SMD 0402; Manufacturer: CCTC; Manufacturer Part Number: TCC0402X7R181K500AT; Package Size: 0402; JLCPCB Basic Part: No; JLCPCB Part Number: C880616; Supplier 1: LCSC; Category: Capacitors - MLCC; Supplier Part Number 1: C880616; Tolerance: ±10%; Voltage Rating: 50V; Temperature Coefficient: X7R; RoHS: Yes; ComponentLink1Description: Datasheet; ComponentLink1URL: https://wmsc.lcsc.com/wmsc/upload/file/pdf/v2/lcsc/2304140030_CCTC-TCC0402X7R181K500AT_C880616.pdf; ComponentLink2Description: JLCPCB Part URL; ComponentLink2URL: https://jlcpcb.com/partdetail/C880616; ComponentLink3Description: LCSC Part URL; ComponentLink3URL: https://lcsc.com/product-detail/Multilayer-Ceramic-Capacitors-MLCC---SMD-SMT_CCTC-CCTC-TCC0402X7R181K500AT_C880616.html
footprint CAP-0402 (0402 (1005M) Capacitor)
pins: 1, 2

## TCC0402X7R182K500AT
designator C?  Capacitance: 1.8nF  (hidden comment: *)
Capacitor, Ceramic (MLCC), 1.8nF, ±10%, 50V, X7R, ±10%, SMD 0402; Manufacturer: CCTC; Manufacturer Part Number: TCC0402X7R182K500AT; Package Size: 0402; JLCPCB Basic Part: No; JLCPCB Part Number: C696873; Supplier 1: LCSC; Category: Capacitors - MLCC; Supplier Part Number 1: C696873; Tolerance: ±10%; Voltage Rating: 50V; Temperature Coefficient: X7R; RoHS: Yes; ComponentLink1Description: Datasheet; ComponentLink1URL: https://wmsc.lcsc.com/wmsc/upload/file/pdf/v2/lcsc/2304140030_CCTC-TCC0402X7R182K500AT_C696873.pdf; ComponentLink2Description: JLCPCB Part URL; ComponentLink2URL: https://jlcpcb.com/partdetail/C696873; ComponentLink3Description: LCSC Part URL; ComponentLink3URL: https://lcsc.com/product-detail/Multilayer-Ceramic-Capacitors-MLCC---SMD-SMT_CCTC-CCTC-TCC0402X7R182K500AT_C696873.html
footprint CAP-0402 (0402 (1005M) Capacitor)
pins: 1, 2

## TCC0402X7R202K500AT
designator C?  Capacitance: 2nF  (hidden comment: *)
Capacitor, Ceramic (MLCC), 2nF, ±10%, 50V, X7R, ±10%, SMD 0402; Manufacturer: CCTC; Manufacturer Part Number: TCC0402X7R202K500AT; Package Size: 0402; JLCPCB Basic Part: No; JLCPCB Part Number: C5448822; Supplier 1: LCSC; Category: Capacitors - MLCC; Supplier Part Number 1: C5448822; Tolerance: ±10%; Voltage Rating: 50V; Temperature Coefficient: X7R; RoHS: Yes; ComponentLink1Description: Datasheet; ComponentLink1URL: https://wmsc.lcsc.com/wmsc/upload/file/pdf/v2/lcsc/2403281711_CCTC-TCC0402X7R202K500AT_C5448822.pdf; ComponentLink2Description: JLCPCB Part URL; ComponentLink2URL: https://jlcpcb.com/partdetail/C5448822; ComponentLink3Description: LCSC Part URL; ComponentLink3URL: https://lcsc.com/product-detail/Multilayer-Ceramic-Capacitors-MLCC---SMD-SMT_CCTC-CCTC-TCC0402X7R202K500AT_C5448822.html
footprint CAP-0402 (0402 (1005M) Capacitor)
pins: 1, 2

## TCC0402X7R203K500AT
designator C?  Capacitance: 20nF  (hidden comment: *)
Capacitor, Ceramic (MLCC), 20nF, ±10%, 50V, X7R, ±10%, SMD 0402; Manufacturer: CCTC; Manufacturer Part Number: TCC0402X7R203K500AT; Package Size: 0402; JLCPCB Basic Part: No; JLCPCB Part Number: C5448807; Supplier 1: LCSC; Category: Capacitors - MLCC; Supplier Part Number 1: C5448807; Tolerance: ±10%; Voltage Rating: 50V; Temperature Coefficient: X7R; RoHS: Yes; ComponentLink1Description: Datasheet; ComponentLink1URL: https://wmsc.lcsc.com/wmsc/upload/file/pdf/v2/lcsc/2403281711_CCTC-TCC0402X7R203K500AT_C5448807.pdf; ComponentLink2Description: JLCPCB Part URL; ComponentLink2URL: https://jlcpcb.com/partdetail/C5448807; ComponentLink3Description: LCSC Part URL; ComponentLink3URL: https://lcsc.com/product-detail/Multilayer-Ceramic-Capacitors-MLCC---SMD-SMT_CCTC-CCTC-TCC0402X7R203K500AT_C5448807.html
footprint CAP-0402 (0402 (1005M) Capacitor)
pins: 1, 2

## TCC0402X7R221K500AT
designator C?  Capacitance: 220pF  (hidden comment: *)
Capacitor, Ceramic (MLCC), 220pF, ±10%, 50V, X7R, ±10%, SMD 0402; Manufacturer: CCTC; Manufacturer Part Number: TCC0402X7R221K500AT; Package Size: 0402; JLCPCB Basic Part: No; JLCPCB Part Number: C466236; Supplier 1: LCSC; Category: Capacitors - MLCC; Supplier Part Number 1: C466236; Tolerance: ±10%; Voltage Rating: 50V; Temperature Coefficient: X7R; RoHS: Yes; ComponentLink1Description: Datasheet; ComponentLink1URL: https://wmsc.lcsc.com/wmsc/upload/file/pdf/v2/lcsc/2304140030_CCTC-TCC0402X7R221K500AT_C466236.pdf; ComponentLink2Description: JLCPCB Part URL; ComponentLink2URL: https://jlcpcb.com/partdetail/C466236; ComponentLink3Description: LCSC Part URL; ComponentLink3URL: https://lcsc.com/product-detail/Multilayer-Ceramic-Capacitors-MLCC---SMD-SMT_CCTC-CCTC-TCC0402X7R221K500AT_C466236.html
footprint CAP-0402 (0402 (1005M) Capacitor)
pins: 1, 2

## TCC0402X7R221M500AT
designator C?  Capacitance: 220pF  (hidden comment: *)
Capacitor, Ceramic (MLCC), 220pF, ±20%, 50V, X7R, ±20%, SMD 0402; Manufacturer: CCTC; Manufacturer Part Number: TCC0402X7R221M500AT; Package Size: 0402; JLCPCB Basic Part: No; JLCPCB Part Number: C696872; Supplier 1: LCSC; Category: Capacitors - MLCC; Supplier Part Number 1: C696872; Tolerance: ±20%; Voltage Rating: 50V; Temperature Coefficient: X7R; RoHS: Yes; ComponentLink1Description: Datasheet; ComponentLink1URL: https://wmsc.lcsc.com/wmsc/upload/file/pdf/v2/lcsc/2304140030_CCTC-TCC0402X7R221M500AT_C696872.pdf; ComponentLink2Description: JLCPCB Part URL; ComponentLink2URL: https://jlcpcb.com/partdetail/C696872; ComponentLink3Description: LCSC Part URL; ComponentLink3URL: https://lcsc.com/product-detail/Multilayer-Ceramic-Capacitors-MLCC---SMD-SMT_CCTC-CCTC-TCC0402X7R221M500AT_C696872.html
footprint CAP-0402 (0402 (1005M) Capacitor)
pins: 1, 2

## TCC0402X7R222K500AT
designator C?  Capacitance: 2200pF  (hidden comment: *)
Capacitor, Ceramic (MLCC), 2200pF, ±10%, 50V, X7R, ±10%, SMD 0402; Manufacturer: CCTC; Manufacturer Part Number: TCC0402X7R222K500AT; Package Size: 0402; JLCPCB Basic Part: No; JLCPCB Part Number: C915853; Supplier 1: LCSC; Category: Capacitors - MLCC; Supplier Part Number 1: C915853; Tolerance: ±10%; Voltage Rating: 50V; Temperature Coefficient: X7R; RoHS: Yes; ComponentLink1Description: Datasheet; ComponentLink1URL: https://wmsc.lcsc.com/wmsc/upload/file/pdf/v2/lcsc/2304140030_CCTC-TCC0402X7R222K500AT_C915853.pdf; ComponentLink2Description: JLCPCB Part URL; ComponentLink2URL: https://jlcpcb.com/partdetail/C915853; ComponentLink3Description: LCSC Part URL; ComponentLink3URL: https://lcsc.com/product-detail/Multilayer-Ceramic-Capacitors-MLCC---SMD-SMT_CCTC-CCTC-TCC0402X7R222K500AT_C915853.html
footprint CAP-0402 (0402 (1005M) Capacitor)
pins: 1, 2

## TCC0402X7R223K160AT
designator C?  Capacitance: 22nF  (hidden comment: *)
Capacitor, Ceramic (MLCC), 22nF, ±10%, 16V, X7R, ±10%, SMD 0402; Manufacturer: CCTC; Manufacturer Part Number: TCC0402X7R223K160AT; Package Size: 0402; JLCPCB Basic Part: No; JLCPCB Part Number: C380304; Supplier 1: LCSC; Category: Capacitors - MLCC; Supplier Part Number 1: C380304; Tolerance: ±10%; Voltage Rating: 16V; Temperature Coefficient: X7R; RoHS: Yes; ComponentLink1Description: Datasheet; ComponentLink1URL: https://wmsc.lcsc.com/wmsc/upload/file/pdf/v2/lcsc/2304140030_CCTC-TCC0402X7R223K160AT_C380304.pdf; ComponentLink2Description: JLCPCB Part URL; ComponentLink2URL: https://jlcpcb.com/partdetail/C380304; ComponentLink3Description: LCSC Part URL; ComponentLink3URL: https://lcsc.com/product-detail/Multilayer-Ceramic-Capacitors-MLCC---SMD-SMT_CCTC-CCTC-TCC0402X7R223K160AT_C380304.html
footprint CAP-0402 (0402 (1005M) Capacitor)
pins: 1, 2

## TCC0402X7R223K250AT
designator C?  Capacitance: 22nF  (hidden comment: *)
Capacitor, Ceramic (MLCC), 22nF, ±10%, 25V, X7R, ±10%, SMD 0402; Manufacturer: CCTC; Manufacturer Part Number: TCC0402X7R223K250AT; Package Size: 0402; JLCPCB Basic Part: No; JLCPCB Part Number: C466237; Supplier 1: LCSC; Category: Capacitors - MLCC; Supplier Part Number 1: C466237; Tolerance: ±10%; Voltage Rating: 25V; Temperature Coefficient: X7R; RoHS: Yes; ComponentLink1Description: Datasheet; ComponentLink1URL: https://wmsc.lcsc.com/wmsc/upload/file/pdf/v2/lcsc/2304140030_CCTC-TCC0402X7R223K250AT_C466237.pdf; ComponentLink2Description: JLCPCB Part URL; ComponentLink2URL: https://jlcpcb.com/partdetail/C466237; ComponentLink3Description: LCSC Part URL; ComponentLink3URL: https://lcsc.com/product-detail/Multilayer-Ceramic-Capacitors-MLCC---SMD-SMT_CCTC-CCTC-TCC0402X7R223K250AT_C466237.html
footprint CAP-0402 (0402 (1005M) Capacitor)
pins: 1, 2

## TCC0402X7R223K500AT
designator C?  Capacitance: 22nF  (hidden comment: *)
Capacitor, Ceramic (MLCC), 22nF, ±10%, 50V, X7R, ±10%, SMD 0402; Manufacturer: CCTC; Manufacturer Part Number: TCC0402X7R223K500AT; Package Size: 0402; JLCPCB Basic Part: No; JLCPCB Part Number: C380305; Supplier 1: LCSC; Category: Capacitors - MLCC; Supplier Part Number 1: C380305; Tolerance: ±10%; Voltage Rating: 50V; Temperature Coefficient: X7R; RoHS: Yes; ComponentLink1Description: Datasheet; ComponentLink1URL: https://wmsc.lcsc.com/wmsc/upload/file/pdf/v2/lcsc/2304140030_CCTC-TCC0402X7R223K500AT_C380305.pdf; ComponentLink2Description: JLCPCB Part URL; ComponentLink2URL: https://jlcpcb.com/partdetail/C380305; ComponentLink3Description: LCSC Part URL; ComponentLink3URL: https://lcsc.com/product-detail/Multilayer-Ceramic-Capacitors-MLCC---SMD-SMT_CCTC-CCTC-TCC0402X7R223K500AT_C380305.html
footprint CAP-0402 (0402 (1005M) Capacitor)
pins: 1, 2
